# Altium footprint library IC.PCBLIB: 359 footprints (part 19 of 23)
Each footprint in its own frame and in the unit in brackets; x right, y up, seen from the top. Pads: shape width x height; smd on the part's side, far side on the other; paste and mask are expansions set on the pad; w line width, h text height; cw(c..) or ccw(c..) is an arc to the next point about the centre after c.
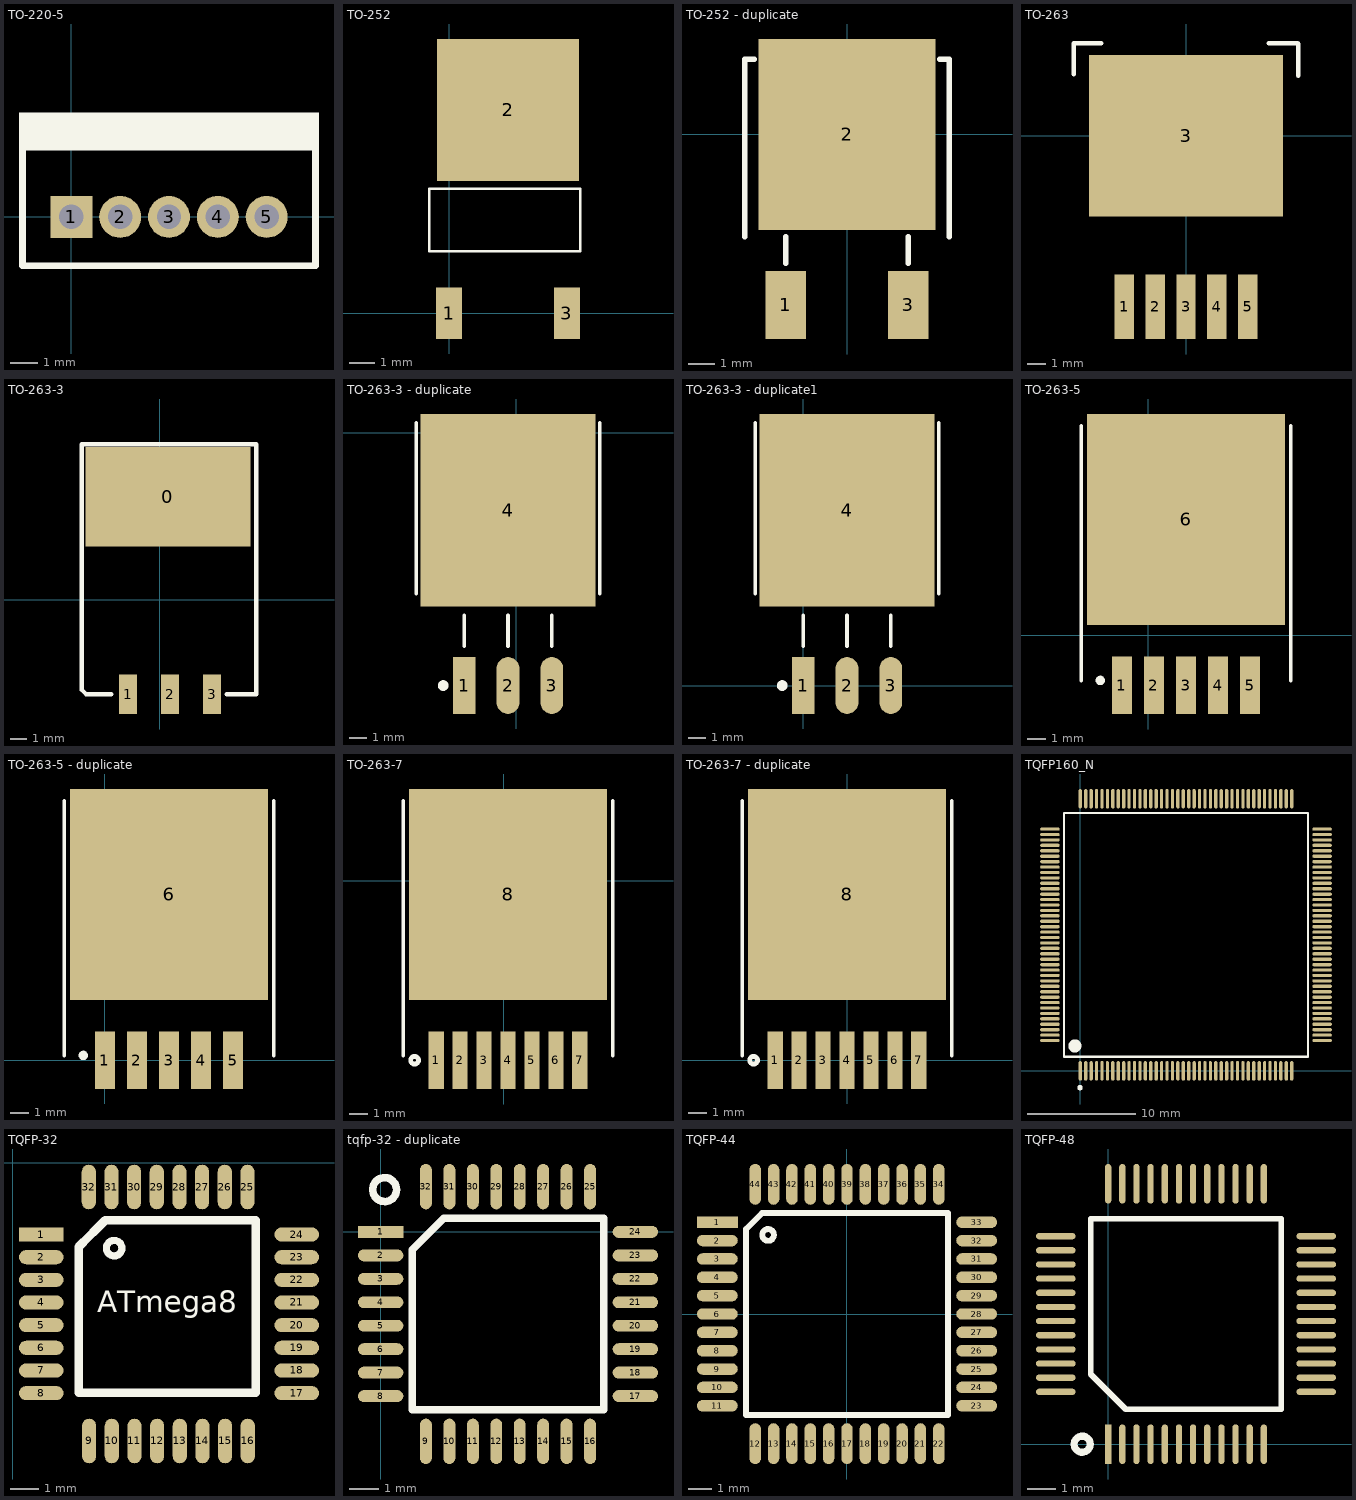
[diagram p18: the footprints below, top view; thin cyan lines are the x and y axes]

## TO-220-5 [mil]
pads (5):
  rect 60x60 hole 35: 1(0,0)
  round 60 hole 35: 2(70,0) 3(140,0) 4(210,0) 5(280,0)
TopOverlay:
  rectangle: -75,100 355,150
  lines w10: -70,-70 350,-70 350,100 -70,100 -70,-70

## TO-252 [mm] "TO-252"
pads (3):
  rect 1x2 smd: 1(0,0) 3(4.57,0)
  rect 5.5x5.5 smd: 2(2.286,7.874)
TopOverlay:
  lines w0.1: -0.762,2.4 -0.762,4.826 5.08,4.826 5.08,2.4 -0.762,2.4

## TO-252 - duplicate [mil]
height 88
pads (3):
  rect 59.06x100 smd: 1(-90,-250) 3(90,-250)
  rect 260x280 smd: 2(0,0)
TopOverlay:
  lines w8: -150,-150 -150,110 -136,110 ; -90,-189 -90,-150 ; 90,-189 90,-150 ; 136,110 150,110 150,-150

## TO-263 [mil]
pads (6):
  rect 42x140 smd: 1(-134,-370) 2(-67,-370) 3(0,-370) 4(67,-370) 5(134,-370)
  rect 420x350 smd: 3(0,0)
TopOverlay:
  lines w10: -243,134 -243,201 -184,201 ; 179,201 242,201 243,200 243,130

## TO-263-3 [mm] "贴片封装"
pads (4):
  rect 10x6 smd: 0(0.508,6.223)
  rect 1.07x2.4 smd: 1(-1.905,-5.715) 2(0.635,-5.715) 3(3.175,-5.715)
TopOverlay:
  lines w0.254: -2.921,-5.715 -4.445,-5.715 -4.699,-5.461 -4.699,9.398 5.842,9.398 5.842,-5.715 4.064,-5.715

## TO-263-3 - duplicate [mil]
pads (4):
  rect 52x130 smd: 1(-119,-577)
  oval 52x130 smd: 2(-19,-577) 3(81,-577)
  rect 400x440 smd: 4(-19,-177)
TopOverlay:
  circle w12: c-167.08,-577 r6.08
  lines w7.87: -229,-367 -229,23 ; 191,-367 191,23
  lines w8: -119,-487 -119,-417 ; -19,-487 -19,-417 ; 81,-487 81,-417

## TO-263-3 - duplicate1 [mil]
pads (4):
  rect 52x130 smd: 1(0,0)
  oval 52x130 smd: 2(100,0) 3(200,0)
  rect 400x440 smd: 4(100,400)
TopOverlay:
  circle w12: c-48.08,0 r6.08
  lines w7.87: -110,210 -110,600 ; 310,210 310,600
  lines w8: 0,90 0,160 ; 100,90 100,160 ; 200,90 200,160

## TO-263-5 [mil]
pads (6):
  rect 42x120 smd: 1(-55,-104) 2(11.93,-104) 3(78.86,-104) 4(145.79,-104) 5(212.72,-104)
  rect 414x440 smd: 6(78.86,242)
TopOverlay:
  circle w9.84: c-99.92,-94 r4.92
  lines w7.87: -139.65,-94 -139.65,437.5 ; 297.36,-94 297.36,437.5

## TO-263-5 - duplicate [mil]
pads (6):
  rect 42x120 smd: 1(0,0) 2(66.93,0) 3(133.86,0) 4(200.79,0) 5(267.72,0)
  rect 414x440 smd: 6(133.86,346)
TopOverlay:
  circle w9.84: c-44.92,10 r4.92
  lines w7.87: -84.65,10 -84.65,541.5 ; 352.36,10 352.36,541.5

## TO-263-7 [mil]
pads (8):
  rect 32x120 smd: 1(-141,-375) 2(-91,-375) 3(-41,-375) 4(9,-375) 5(59,-375) 6(109,-375) 7(159,-375)
  rect 414x440 smd: 8(9,-29)
TopOverlay:
  circle w9.84: c-185.92,-375 r8.08
  lines w7.87: -209.5,-365 -209.5,166.5 ; 227.5,-365 227.5,166.5

## TO-263-7 - duplicate [mil]
pads (8):
  rect 32x120 smd: 1(-150,0) 2(-100,0) 3(-50,0) 4(0,0) 5(50,0) 6(100,0) 7(150,0)
  rect 414x440 smd: 8(0,346)
TopOverlay:
  circle w9.84: c-194.92,0 r8.08
  lines w7.87: -218.5,10 -218.5,541.5 ; 218.5,10 218.5,541.5

## TQFP160_N [mm]
pads (160):
  oval 0.3x1.8 smd: 1(0,0) 2(0.5,0) 3(1,0) 4(1.5,0) 5(2,0) 6(2.5,0) 7(3,0) 8(3.5,0) 9(4,0) 10(4.5,0) 11(5,0) 12(5.5,0) 13(6,0) 14(6.5,0) 15(7,0) 16(7.5,0) 17(8,0) 18(8.5,0) 19(9,0) 20(9.5,0) 21(10,0) 22(10.5,0) 23(11,0) 24(11.5,0) 25(12,0) 26(12.5,0) 27(13,0) 28(13.5,0) 29(14,0) 30(14.5,0) 31(15,0) 32(15.5,0) 33(16,0) 34(16.5,0) 35(17,0) 36(17.5,0) 37(18,0) 38(18.5,0) 39(19,0) 40(19.5,0) 81(19.5,25.1) 82(19,25.1) 83(18.5,25.1) 84(18,25.1) 85(17.5,25.1) 86(17,25.1) 87(16.5,25.1) 88(16,25.1) 89(15.5,25.1) 90(15,25.1) 91(14.5,25.1) 92(14,25.1) 93(13.5,25.1) 94(13,25.1) 95(12.5,25.1) 96(12,25.1) 97(11.5,25.1) 98(11,25.1) 99(10.5,25.1) 100(10,25.1) 101(9.5,25.1) 102(9,25.1) 103(8.5,25.1) 104(8,25.1) 105(7.5,25.1) 106(7,25.1) 107(6.5,25.1) 108(6,25.1) 109(5.5,25.1) 110(5,25.1) 111(4.5,25.1) 112(4,25.1) 113(3.5,25.1) 114(3,25.1) 115(2.5,25.1) 116(2,25.1) 117(1.5,25.1) 118(1,25.1) 119(0.5,25.1) 120(0,25.1)
  oval 1.8x0.3 smd: 41(22.3,2.8) 42(22.3,3.3) 43(22.3,3.8) 44(22.3,4.3) 45(22.3,4.8) 46(22.3,5.3) 47(22.3,5.8) 48(22.3,6.3) 49(22.3,6.8) 50(22.3,7.3) 51(22.3,7.8) 52(22.3,8.3) 53(22.3,8.8) 54(22.3,9.3) 55(22.3,9.8) 56(22.3,10.3) 57(22.3,10.8) 58(22.3,11.3) 59(22.3,11.8) 60(22.3,12.3) 61(22.3,12.8) 62(22.3,13.3) 63(22.3,13.8) 64(22.3,14.3) 65(22.3,14.8) 66(22.3,15.3) 67(22.3,15.8) 68(22.3,16.3) 69(22.3,16.8) 70(22.3,17.3) 71(22.3,17.8) 72(22.3,18.3) 73(22.3,18.8) 74(22.3,19.3) 75(22.3,19.8) 76(22.3,20.3) 77(22.3,20.8) 78(22.3,21.3) 79(22.3,21.8) 80(22.3,22.3) 121(-2.8,22.3) 122(-2.8,21.8) 123(-2.8,21.3) 124(-2.8,20.8) 125(-2.8,20.3) 126(-2.8,19.8) 127(-2.8,19.3) 128(-2.8,18.8) 129(-2.8,18.3) 130(-2.8,17.8) 131(-2.8,17.3) 132(-2.8,16.8) 133(-2.8,16.3) 134(-2.8,15.8) 135(-2.8,15.3) 136(-2.8,14.8) 137(-2.8,14.3) 138(-2.8,13.8) 139(-2.8,13.3) 140(-2.8,12.8) 141(-2.8,12.3) 142(-2.8,11.8) 143(-2.8,11.3) 144(-2.8,10.8) 145(-2.8,10.3) 146(-2.8,9.8) 147(-2.8,9.3) 148(-2.8,8.8) 149(-2.8,8.3) 150(-2.8,7.8) 151(-2.8,7.3) 152(-2.8,6.8) 153(-2.8,6.3) 154(-2.8,5.8) 155(-2.8,5.3) 156(-2.8,4.8) 157(-2.8,4.3) 158(-2.8,3.8) 159(-2.8,3.3) 160(-2.8,2.8)
TopOverlay:
  circle w0.25: c-0.027,-1.547 r0.125
  circle w0.6: c-0.5,2.3 r0.3
  lines w0.2: -1.5,1.3 21,1.3 21,23.8 -1.5,23.8 -1.5,1.3

## TQFP-32 [mil]
pads (32):
  rect 62x19.68 smd: 1(40,-100)
  oval 62x19.68 smd: 2(40,-131.5) 3(40,-162.99) 4(40,-194.49) 5(40,-225.98) 6(40,-257.48) 7(40,-288.98) 8(40,-320.47) 17(395,-320.47) 18(395,-288.98) 19(395,-257.48) 20(395,-225.98) 21(395,-194.49) 22(395,-162.99) 23(395,-131.5) 24(395,-100)
  oval 19.68x62 smd: 9(106.51,-387) 10(138.01,-387) 11(169.5,-387) 12(201,-387) 13(232.5,-387) 14(263.99,-387) 15(295.49,-387) 16(326.98,-387) 25(326.52,-33.95) 26(295.02,-33.95) 27(263.53,-33.95) 28(232.03,-33.95) 29(200.53,-33.95) 30(169.04,-33.95) 31(137.54,-33.95) 32(106.05,-33.95)
TopOverlay:
  circle w10: c141.23,-119 r10.77
  lines w12: 93,-116 129,-80 338,-80 338,-320 92,-320 92,-117 98.99,-110.01
  text "ATmega8" at 118,-208 h30

## tqfp-32 - duplicate [mil]
pads (32):
  rect 60x15.75 smd: 1(0,0)
  oval 60x15.75 smd: 2(0,-31) 3(0,-62) 4(0,-93) 5(0,-124) 6(0,-155) 7(0,-186) 8(0,-217) 17(336.69,-217) 18(336.69,-186) 19(336.69,-155) 20(336.69,-124) 21(336.69,-93) 22(336.69,-62) 23(336.69,-31) 24(336.69,0)
  oval 15.75x60 smd: 9(59.84,-276.84) 10(90.84,-276.84) 11(121.84,-276.84) 12(152.84,-276.84) 13(183.84,-276.84) 14(214.84,-276.84) 15(245.84,-276.84) 16(276.84,-276.84) 25(276.84,59.84) 26(245.84,59.84) 27(214.84,59.84) 28(183.84,59.84) 29(152.84,59.84) 30(121.84,59.84) 31(90.84,59.84) 32(59.84,59.84)
TopOverlay:
  circle w10: c5.19,56 r15.81
  lines w10: 41.77,-235.07 294.91,-235.07 294.91,18.07 83.54,18.07 41.77,-23.7 41.77,-235.07

## TQFP-44 [mm]
pads (44):
  rect 1.778x0.5 smd: 1(-5.65,4)
  oval 1.778x0.5 smd: 2(-5.65,3.2) 3(-5.65,2.4) 4(-5.65,1.6) 5(-5.65,0.8) 6(-5.65,0) 7(-5.65,-0.8) 8(-5.65,-1.6) 9(-5.65,-2.4) 10(-5.65,-3.2) 11(-5.65,-4) 23(5.65,-4) 24(5.65,-3.2) 25(5.65,-2.4) 26(5.65,-1.6) 27(5.65,-0.8) 28(5.65,0) 29(5.65,0.8) 30(5.65,1.6) 31(5.65,2.4) 32(5.65,3.2) 33(5.65,4)
  oval 0.5x1.778 smd: 12(-4,-5.65) 13(-3.2,-5.65) 14(-2.4,-5.65) 15(-1.6,-5.65) 16(-0.8,-5.65) 17(0,-5.65) 18(0.8,-5.65) 19(1.6,-5.65) 20(2.4,-5.65) 21(3.2,-5.65) 22(4,-5.65) 34(4,5.65) 35(3.2,5.65) 36(2.4,5.65) 37(1.6,5.65) 38(0.8,5.65) 39(0,5.65) 40(-0.8,5.65) 41(-1.6,5.65) 42(-2.4,5.65) 43(-3.2,5.65) 44(-4,5.65)
TopOverlay:
  circle w0.254: c-3.441,3.446 r0.255
  lines w0.127: -4.4,3.7 -4.4,3.7
  lines w0.25: -4.4,-4.4 4.4,-4.4 4.4,4.4
  lines w0.254: -4.4,-4.4 -4.4,3.7 -3.7,4.4 4.4,4.4

## TQFP-48 [mm]
pads (48):
  rect 0.22x1.4 smd: 1(0,0)
  oval 0.22x1.4 smd: 2(0.5,0) 3(1,0) 4(1.5,0) 5(2,0) 6(2.5,0) 7(3,0) 8(3.5,0) 9(4,0) 10(4.5,0) 11(5,0) 12(5.5,0) 25(5.5,9.2) 26(5,9.2) 27(4.5,9.2) 28(4,9.2) 29(3.5,9.2) 30(3,9.2) 31(2.5,9.2) 32(2,9.2) 33(1.5,9.2) 34(1,9.2) 35(0.5,9.2) 36(0,9.2)
  oval 1.4x0.22 smd: 13(7.35,1.85) 14(7.35,2.35) 15(7.35,2.85) 16(7.35,3.35) 17(7.35,3.85) 18(7.35,4.35) 19(7.35,4.85) 20(7.35,5.35) 21(7.35,5.85) 22(7.35,6.35) 23(7.35,6.85) 24(7.35,7.35) 37(-1.85,7.35) 38(-1.85,6.85) 39(-1.85,6.35) 40(-1.85,5.85) 41(-1.85,5.35) 42(-1.85,4.85) 43(-1.85,4.35) 44(-1.85,3.85) 45(-1.85,3.35) 46(-1.85,2.85) 47(-1.85,2.35) 48(-1.85,1.85)
TopOverlay:
  circle w0.254: c-0.919,0 r0.284
  lines w0.2: -0.615,2.47 0.62,1.235 6.115,1.235 6.115,7.965 -0.615,7.965 -0.615,2.47